# Altium footprint library 针式电感.PcbLib: 75 footprints (part 2 of 5)
Each footprint in its own frame and in the unit in brackets; x right, y up, seen from the top. Pads: shape width x height; smd on the part's side, far side on the other; paste and mask are expansions set on the pad; w line width, h text height; cw(c..) or ccw(c..) is an arc to the next point about the centre after c.
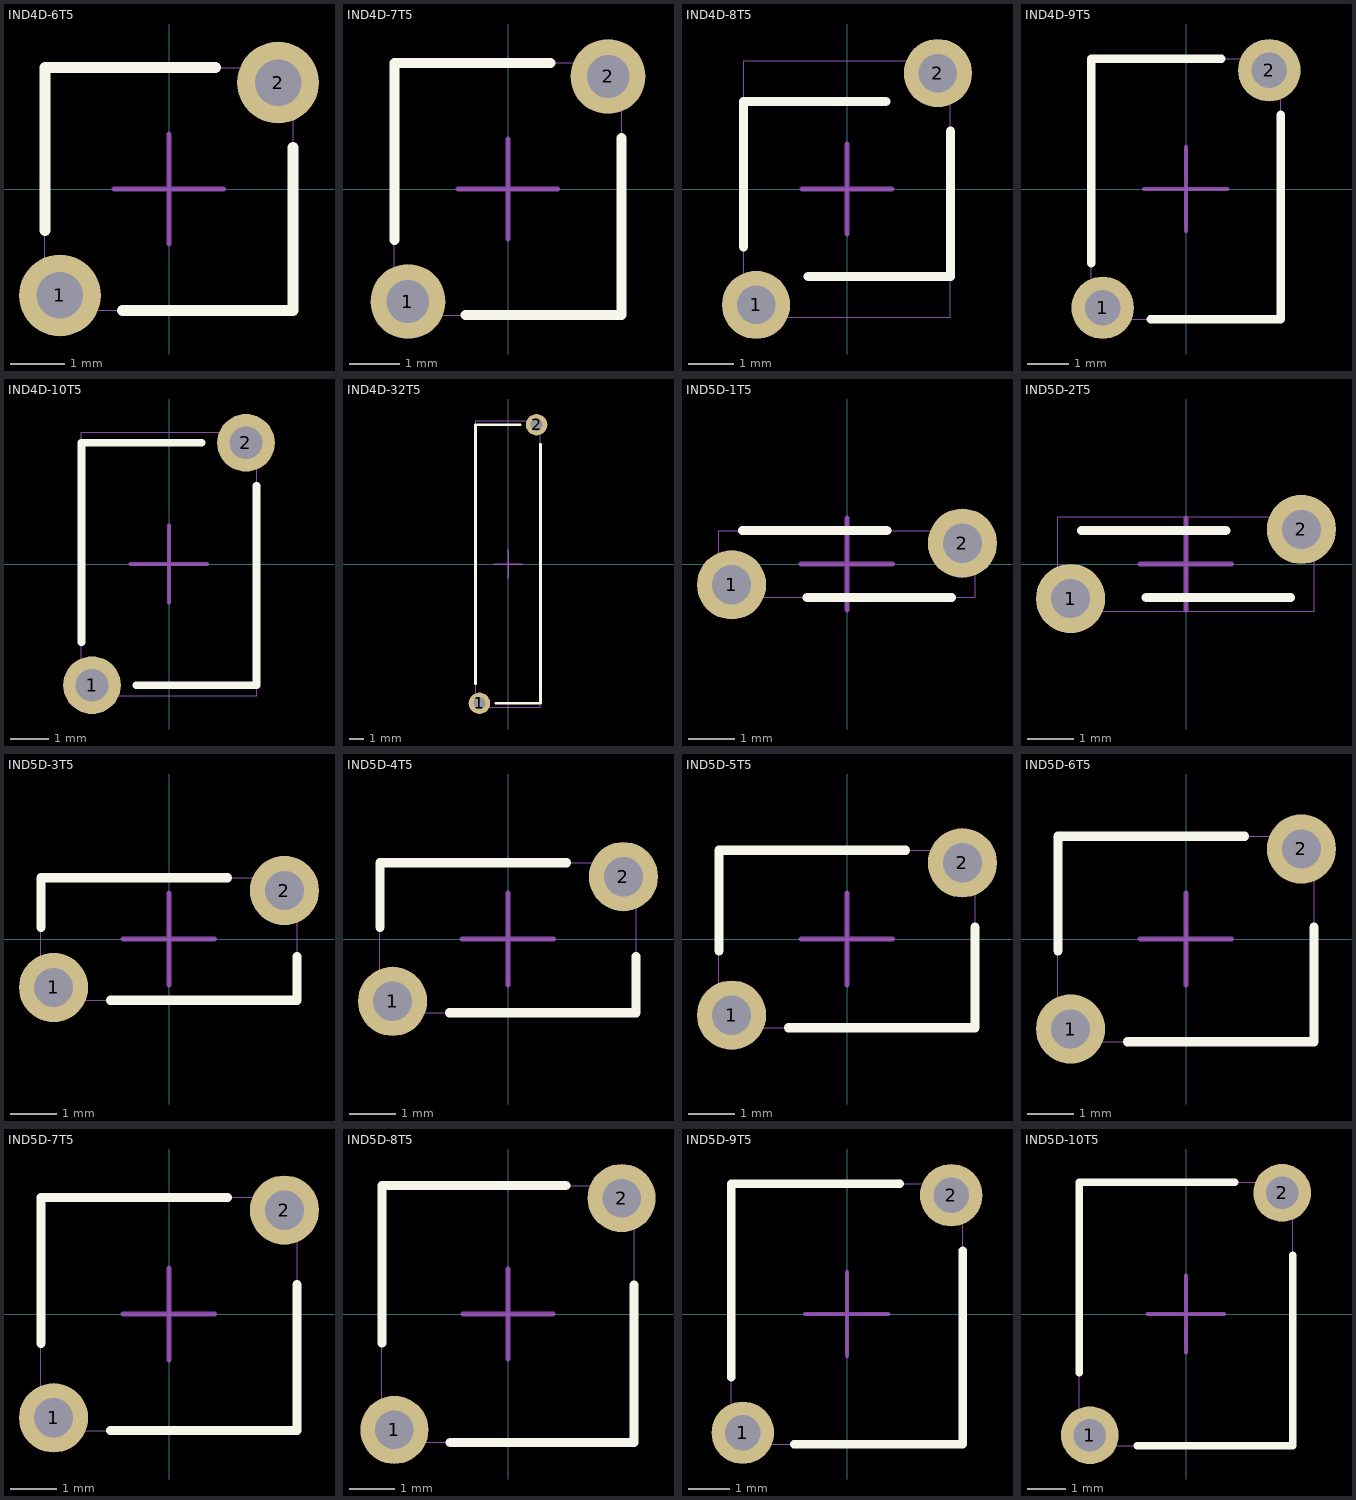
[diagram p1: the footprints below, top view; thin cyan lines are the x and y axes]

## IND4D-6T5 [mm] "空芯线圈"
height 4.5
pads (2):
  round 1.5 hole 0.85 unplated: 1(-2,-1.95) 2(2,1.95)
Top Overlay:
  lines w0.2: -2.275,-0.762 -2.275,2.225 0.853,2.225 ; -0.853,-2.225 2.275,-2.225 2.275,0.762
Mechanical 13:
  lines w0.01: -2.275,-2.225 -2.275,2.225 2.275,2.225 2.275,-2.225 -2.275,-2.225
Mechanical 15:
  lines w0.1: -1,0 0.991,0 ; 0,-1 0,1
3D body: height 4.77, standoff -3.5, extent -2.275,-2.225 2.275,2.225

## IND4D-7T5 [mm] "空芯线圈"
height 4.5
pads (2):
  round 1.5 hole 0.85 unplated: 1(-2,-2.25) 2(2,2.25)
Top Overlay:
  lines w0.2: -2.275,-1.016 -2.275,2.525 0.853,2.525 ; -0.853,-2.525 2.275,-2.525 2.275,1.016
Mechanical 13:
  lines w0.01: -2.275,-2.525 -2.275,2.525 2.275,2.525 2.275,-2.525 -2.275,-2.525
Mechanical 15:
  lines w0.1: -1,0 0.991,0 ; 0,-1 0,1
3D body: height 4.77, standoff -3.5, extent -2.275,-2.525 2.275,2.525

## IND4D-8T5 [mm] "空芯线圈"
height 4.5
pads (2):
  round 1.5 hole 0.85 unplated: 1(-2,-2.55) 2(2,2.55)
Top Overlay:
  lines w0.2: -2.275,-1.27 -2.275,1.925 0.853,1.925 ; -0.853,-1.925 2.275,-1.925 2.275,1.27
Mechanical 13:
  lines w0.01: -2.275,-2.825 -2.275,2.825 2.275,2.825 2.275,-2.825 -2.275,-2.825
Mechanical 15:
  lines w0.1: -1,0 0.991,0 ; 0,-1 0,1
3D body: height 4.77, standoff -3.5, extent -2.275,-2.825 2.275,2.825

## IND4D-9T5 [mm] "空芯线圈"
height 4.5
pads (2):
  round 1.5 hole 0.85 unplated: 1(-2,-2.85) 2(2,2.85)
Top Overlay:
  lines w0.2: -2.275,-1.778 -2.275,3.125 0.853,3.125 ; -0.853,-3.125 2.275,-3.125 2.275,1.778
Mechanical 13:
  lines w0.01: -2.275,-3.125 -2.275,3.125 2.275,3.125 2.275,-3.125 -2.275,-3.125
Mechanical 15:
  lines w0.1: -1,0 0.991,0 ; 0,-1 0,1
3D body: height 4.77, standoff -3.5, extent -2.275,-3.125 2.275,3.125

## IND4D-10T5 [mm] "空芯线圈"
height 4.5
pads (2):
  round 1.5 hole 0.85 unplated: 1(-2,-3.15) 2(2,3.15)
Top Overlay:
  lines w0.2: -2.275,-2.032 -2.275,3.15 0.853,3.15 ; -0.853,-3.15 2.275,-3.15 2.275,2.032
Mechanical 13:
  lines w0.01: -2.275,-3.425 -2.275,3.425 2.275,3.425 2.275,-3.425 -2.275,-3.425
Mechanical 15:
  lines w0.1: -1,0 0.991,0 ; 0,-1 0,1
3D body: height 4.77, standoff -3.5, extent -2.275,-3.425 2.275,3.425

## IND4D-32T5 [mm] "空芯线圈"
height 4.5
pads (2):
  round 1.5 hole 0.85 unplated: 1(-2,-9.75) 2(2,9.75)
Top Overlay:
  lines w0.2: -2.275,-8.382 -2.275,9.75 0.853,9.75 ; -0.853,-9.75 2.275,-9.75 2.275,8.382
Mechanical 13:
  lines w0.01: -2.275,-10.025 -2.275,10.025 2.275,10.025 2.275,-10.025 -2.275,-10.025
Mechanical 15:
  lines w0.1: -1,0 0.991,0 ; 0,-1 0,1
3D body: height 4.77, standoff -3.5, extent -2.275,-10.025 2.275,10.025

## IND5D-1T5 [mm] "空芯线圈"
height 4.5
pads (2):
  round 1.5 hole 0.85 unplated: 1(-2.5,-0.45) 2(2.5,0.45)
Top Overlay:
  lines w0.2: -2.264,0.725 0.864,0.725 ; -0.864,-0.725 2.264,-0.725
Mechanical 13:
  lines w0.01: -2.775,-0.725 2.775,-0.725 2.775,0.725 -2.775,0.725 -2.775,-0.725
Mechanical 15:
  lines w0.1: -1,0 0.991,0 ; 0,-1 0,1
3D body: height 5.97, standoff -2.8, extent -2.775,-0.725 2.775,0.725

## IND5D-2T5 [mm] "空芯线圈"
height 4.5
pads (2):
  round 1.5 hole 0.85 unplated: 1(-2.5,-0.75) 2(2.5,0.75)
Top Overlay:
  lines w0.2: -2.264,0.725 0.864,0.725 ; -0.864,-0.725 2.264,-0.725
Mechanical 13:
  lines w0.01: -2.775,-1.025 -2.775,1.025 2.775,1.025 2.775,-1.025 -2.775,-1.025
Mechanical 15:
  lines w0.1: -1,0 0.991,0 ; 0,-1 0,1
3D body: height 5.97, standoff -2.8, extent -2.775,-1.025 2.775,1.025

## IND5D-3T5 [mm] "空芯线圈"
height 4.5
pads (2):
  round 1.5 hole 0.85 unplated: 1(-2.5,-1.05) 2(2.5,1.05)
Top Overlay:
  lines w0.2: -2.775,0.254 -2.775,1.325 1.27,1.325 ; -1.27,-1.325 2.775,-1.325 2.775,-0.381
Mechanical 13:
  lines w0.01: -2.775,-1.325 -2.775,1.325 2.775,1.325 2.775,-1.325 -2.775,-1.325
Mechanical 15:
  lines w0.1: -1,0 0.991,0 ; 0,-1 0,1
3D body: height 5.97, standoff -2.8, extent -2.775,-1.325 2.775,1.325

## IND5D-4T5 [mm] "空芯线圈"
height 4.5
pads (2):
  round 1.5 hole 0.85 unplated: 1(-2.5,-1.35) 2(2.5,1.35)
Top Overlay:
  lines w0.2: -2.775,0.254 -2.775,1.651 1.27,1.651 ; -1.27,-1.599 2.775,-1.599 2.775,-0.381
Mechanical 13:
  lines w0.01: -2.775,-1.599 2.775,-1.599 2.775,1.651 -2.775,1.651 -2.775,-1.599
Mechanical 15:
  lines w0.1: -1,0 0.991,0 ; 0,-1 0,1
3D body: height 5.98, standoff -2.8, extent -2.775,-1.599 2.775,1.651

## IND5D-5T5 [mm] "空芯线圈"
height 4.5
pads (2):
  round 1.5 hole 0.85 unplated: 1(-2.5,-1.65) 2(2.5,1.65)
Top Overlay:
  lines w0.2: -2.775,-0.254 -2.775,1.925 1.27,1.925 ; -1.27,-1.925 2.775,-1.925 2.775,0.254
Mechanical 13:
  lines w0.01: -2.775,-1.925 2.775,-1.925 2.775,1.925 -2.775,1.925 -2.775,-1.925
Mechanical 15:
  lines w0.1: -1,0 0.991,0 ; 0,-1 0,1
3D body: height 5.97, standoff -2.8, extent -2.775,-1.925 2.775,1.925

## IND5D-6T5 [mm] "空芯线圈"
height 4.5
pads (2):
  round 1.5 hole 0.85 unplated: 1(-2.5,-1.95) 2(2.5,1.95)
Top Overlay:
  lines w0.2: -2.775,-0.254 -2.775,2.225 1.27,2.225 ; -1.27,-2.225 2.775,-2.225 2.775,0.254
Mechanical 13:
  lines w0.01: -2.775,-2.225 -2.775,2.225 2.775,2.225 2.775,-2.225 -2.775,-2.225
Mechanical 15:
  lines w0.1: -1,0 0.991,0 ; 0,-1 0,1
3D body: height 5.98, standoff -2.8, extent -2.775,-2.225 2.775,2.225

## IND5D-7T5 [mm] "空芯线圈"
height 4.5
pads (2):
  round 1.5 hole 0.85 unplated: 1(-2.5,-2.25) 2(2.5,2.25)
Top Overlay:
  lines w0.2: -2.775,-0.635 -2.775,2.525 1.27,2.525 ; -1.27,-2.525 2.775,-2.525 2.775,0.635
Mechanical 13:
  lines w0.01: -2.775,-2.525 -2.775,2.525 2.775,2.525 2.775,-2.525 -2.775,-2.525
Mechanical 15:
  lines w0.1: -1,0 0.991,0 ; 0,-1 0,1
3D body: height 5.97, standoff -2.8, extent -2.775,-2.525 2.775,2.525

## IND5D-8T5 [mm] "空芯线圈"
height 4.5
pads (2):
  round 1.5 hole 0.85 unplated: 1(-2.5,-2.55) 2(2.5,2.55)
Top Overlay:
  lines w0.2: -2.775,-0.635 -2.775,2.825 1.27,2.825 ; -1.27,-2.825 2.775,-2.825 2.775,0.635
Mechanical 13:
  lines w0.01: -2.775,-2.825 2.775,-2.825 2.775,2.825 -2.775,2.825 -2.775,-2.825
Mechanical 15:
  lines w0.1: -1,0 0.991,0 ; 0,-1 0,1
3D body: height 5.98, standoff -2.8, extent -2.775,-2.825 2.775,2.825

## IND5D-9T5 [mm] "空芯线圈"
height 4.5
pads (2):
  round 1.5 hole 0.85 unplated: 1(-2.5,-2.85) 2(2.5,2.85)
Top Overlay:
  lines w0.2: -2.775,-1.524 -2.775,3.125 1.27,3.125 ; -1.27,-3.125 2.775,-3.125 2.775,1.524
Mechanical 13:
  lines w0.01: -2.775,-3.125 2.775,-3.125 2.775,3.125 -2.775,3.125 -2.775,-3.125
Mechanical 15:
  lines w0.1: -1,0 0.991,0 ; 0,-1 0,1
3D body: height 5.98, standoff -2.8, extent -2.775,-3.125 2.775,3.125

## IND5D-10T5 [mm] "空芯线圈"
height 4.5
pads (2):
  round 1.5 hole 0.85 unplated: 1(-2.5,-3.15) 2(2.5,3.15)
Top Overlay:
  lines w0.2: -2.775,-1.524 -2.775,3.425 1.27,3.425 ; -1.27,-3.425 2.775,-3.425 2.775,1.524
Mechanical 13:
  lines w0.01: -2.775,-3.425 -2.775,3.425 2.775,3.425 2.775,-3.425 -2.775,-3.425
Mechanical 15:
  lines w0.1: -1,0 0.991,0 ; 0,-1 0,1
3D body: height 5.97, standoff -2.8, extent -2.775,-3.425 2.775,3.425